# Altium footprint library LQFP.PcbLib: 36 footprints (part 2 of 3)
Each footprint in its own frame and in the unit in brackets; x right, y up, seen from the top. Pads: shape width x height; smd on the part's side, far side on the other; paste and mask are expansions set on the pad; w line width, h text height; cw(c..) or ccw(c..) is an arc to the next point about the centre after c.
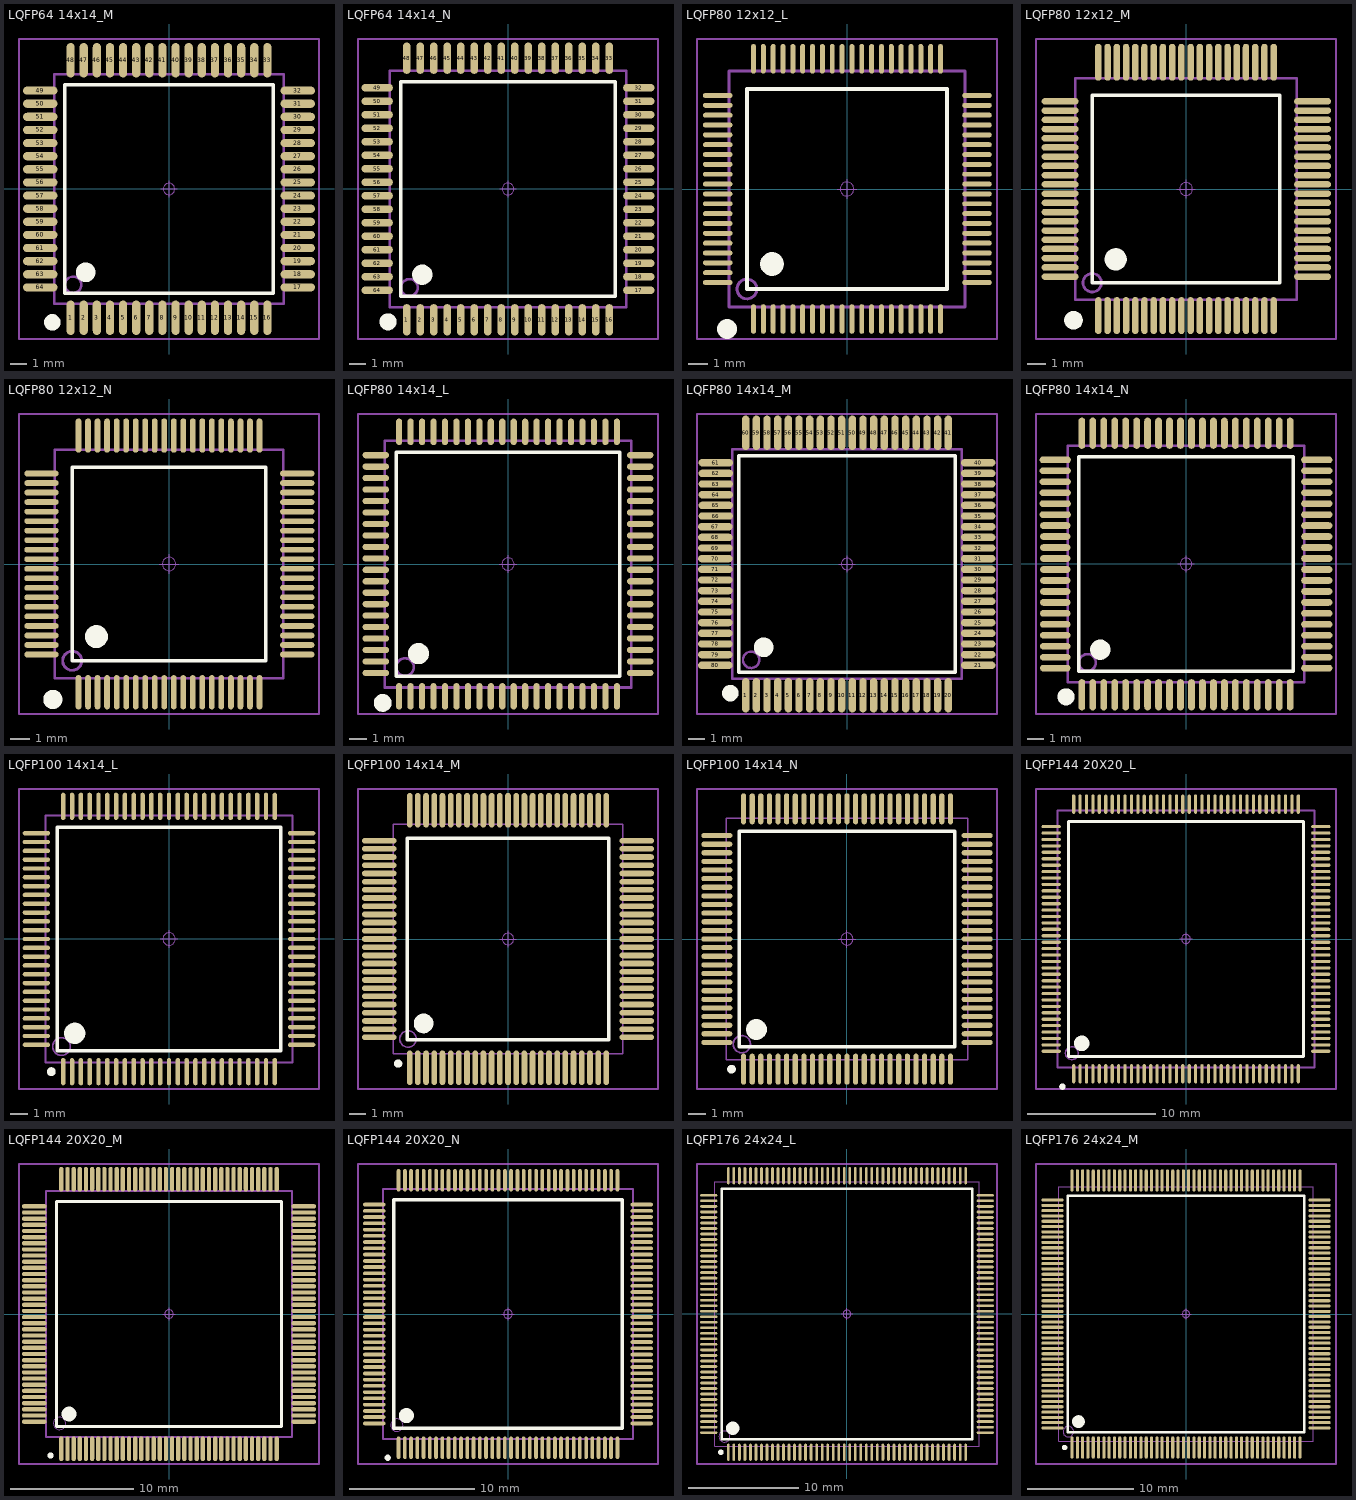
[diagram p1: the footprints below, top view; thin cyan lines are the x and y axes]

## LQFP64 14x14_M [mm] "64脚，体宽14x14mm，脚距0.8mm"
height 1.6
pads (64):
  oval 0.5x2.1 smd: 1(-6,-7.85) 2(-5.2,-7.85) 3(-4.4,-7.85) 4(-3.6,-7.85) 5(-2.8,-7.85) 6(-2,-7.85) 7(-1.2,-7.85) 8(-0.4,-7.85) 9(0.4,-7.85) 10(1.2,-7.85) 11(2,-7.85) 12(2.8,-7.85) 13(3.6,-7.85) 14(4.4,-7.85) 15(5.2,-7.85) 16(6,-7.85) 33(6,7.85) 34(5.2,7.85) 35(4.4,7.85) 36(3.6,7.85) 37(2.8,7.85) 38(2,7.85) 39(1.2,7.85) 40(0.4,7.85) 41(-0.4,7.85) 42(-1.2,7.85) 43(-2,7.85) 44(-2.8,7.85) 45(-3.6,7.85) 46(-4.4,7.85) 47(-5.2,7.85) 48(-6,7.85)
  oval 2.1x0.5 smd: 17(7.85,-6) 18(7.85,-5.2) 19(7.85,-4.4) 20(7.85,-3.6) 21(7.85,-2.8) 22(7.85,-2) 23(7.85,-1.2) 24(7.85,-0.4) 25(7.85,0.4) 26(7.85,1.2) 27(7.85,2) 28(7.85,2.8) 29(7.85,3.6) 30(7.85,4.4) 31(7.85,5.2) 32(7.85,6) 49(-7.85,6) 50(-7.85,5.2) 51(-7.85,4.4) 52(-7.85,3.6) 53(-7.85,2.8) 54(-7.85,2) 55(-7.85,1.2) 56(-7.85,0.4) 57(-7.85,-0.4) 58(-7.85,-1.2) 59(-7.85,-2) 60(-7.85,-2.8) 61(-7.85,-3.6) 62(-7.85,-4.4) 63(-7.85,-5.2) 64(-7.85,-6)
Top Overlay:
  circle w0.6: c-5.08,-5.08 r0.3
  circle w0.508: c-7.112,-8.128 r0.25
  lines w0.2: -6.35,-6.35 -6.35,6.35 6.35,6.35 6.35,-6.35 -6.35,-6.35
Mechanical 13:
  circle w0.15: c-5.842,-5.842 r0.5
  lines w0.15: -7,-7 -7,7 7,7 7,-7 -7,-7
Mechanical 15:
  circle w0.05: c0,0 r0.35
  lines w0.05: -0.5,0 0.5,0 ; 0,-0.5 0,0.5
  lines w0.1: -9.144,-9.144 -9.144,9.144 9.144,9.144 9.144,-9.144 -9.144,-9.144
3D body: height 1.45, standoff 0, extent -8,-8 8,8

## LQFP64 14x14_N [mm] "64脚，体宽14x14mm，脚距0.8mm"
height 1.6
pads (64):
  oval 0.45x1.85 smd: 1(-6,-7.75) 2(-5.2,-7.75) 3(-4.4,-7.75) 4(-3.6,-7.75) 5(-2.8,-7.75) 6(-2,-7.75) 7(-1.2,-7.75) 8(-0.4,-7.75) 9(0.4,-7.75) 10(1.2,-7.75) 11(2,-7.75) 12(2.8,-7.75) 13(3.6,-7.75) 14(4.4,-7.75) 15(5.2,-7.75) 16(6,-7.75) 33(6,7.75) 34(5.2,7.75) 35(4.4,7.75) 36(3.6,7.75) 37(2.8,7.75) 38(2,7.75) 39(1.2,7.75) 40(0.4,7.75) 41(-0.4,7.75) 42(-1.2,7.75) 43(-2,7.75) 44(-2.8,7.75) 45(-3.6,7.75) 46(-4.4,7.75) 47(-5.2,7.75) 48(-6,7.75)
  oval 1.85x0.45 smd: 17(7.75,-6) 18(7.75,-5.2) 19(7.75,-4.4) 20(7.75,-3.6) 21(7.75,-2.8) 22(7.75,-2) 23(7.75,-1.2) 24(7.75,-0.4) 25(7.75,0.4) 26(7.75,1.2) 27(7.75,2) 28(7.75,2.8) 29(7.75,3.6) 30(7.75,4.4) 31(7.75,5.2) 32(7.75,6) 49(-7.75,6) 50(-7.75,5.2) 51(-7.75,4.4) 52(-7.75,3.6) 53(-7.75,2.8) 54(-7.75,2) 55(-7.75,1.2) 56(-7.75,0.4) 57(-7.75,-0.4) 58(-7.75,-1.2) 59(-7.75,-2) 60(-7.75,-2.8) 61(-7.75,-3.6) 62(-7.75,-4.4) 63(-7.75,-5.2) 64(-7.75,-6)
Top Overlay:
  circle w0.6: c-5.08,-5.08 r0.3
  circle w0.508: c-7.112,-7.874 r0.25
  lines w0.2: -6.35,-6.35 -6.35,6.35 6.35,6.35 6.35,-6.35 -6.35,-6.35
Mechanical 13:
  circle w0.15: c-5.842,-5.842 r0.5
  lines w0.15: -7,-7 -7,7 7,7 7,-7 -7,-7
Mechanical 15:
  circle w0.05: c0,0 r0.35
  lines w0.05: -0.5,0 0.5,0 ; 0,-0.5 0,0.5
  lines w0.1: -8.89,-8.89 -8.89,8.89 8.89,8.89 8.89,-8.89 -8.89,-8.89
3D body: height 1.45, standoff 0, extent -8,-8 8,8

## LQFP80 12x12_L [mm] "80脚，体宽12x12mm，脚距0.5mm"
height 1.6
pads (80):
  oval 0.25x1.5 smd: 1(-4.75,-6.604) 2(-4.25,-6.604) 3(-3.75,-6.604) 4(-3.25,-6.604) 5(-2.75,-6.604) 6(-2.25,-6.604) 7(-1.75,-6.604) 8(-1.25,-6.604) 9(-0.75,-6.604) 10(-0.25,-6.604) 11(0.25,-6.604) 12(0.75,-6.604) 13(1.25,-6.604) 14(1.75,-6.604) 15(2.25,-6.604) 16(2.75,-6.604) 17(3.25,-6.604) 18(3.75,-6.604) 19(4.25,-6.604) 20(4.75,-6.604) 41(4.75,6.615) 42(4.25,6.615) 43(3.75,6.615) 44(3.25,6.615) 45(2.75,6.615) 46(2.25,6.615) 47(1.75,6.615) 48(1.25,6.615) 49(0.75,6.615) 50(0.25,6.615) 51(-0.25,6.615) 52(-0.75,6.615) 53(-1.25,6.615) 54(-1.75,6.615) 55(-2.25,6.615) 56(-2.75,6.615) 57(-3.25,6.615) 58(-3.75,6.615) 59(-4.25,6.615) 60(-4.75,6.615)
  oval 1.5x0.25 smd: 21(6.604,-4.75) 22(6.604,-4.25) 23(6.604,-3.75) 24(6.604,-3.25) 25(6.604,-2.75) 26(6.604,-2.25) 27(6.604,-1.75) 28(6.604,-1.25) 29(6.604,-0.75) 30(6.604,-0.25) 31(6.604,0.25) 32(6.604,0.75) 33(6.604,1.25) 34(6.604,1.75) 35(6.604,2.25) 36(6.604,2.75) 37(6.604,3.25) 38(6.604,3.75) 39(6.604,4.25) 40(6.604,4.75) 61(-6.568,4.75) 62(-6.568,4.25) 63(-6.568,3.75) 64(-6.568,3.25) 65(-6.568,2.75) 66(-6.568,2.25) 67(-6.568,1.75) 68(-6.568,1.25) 69(-6.568,0.75) 70(-6.568,0.25) 71(-6.568,-0.25) 72(-6.568,-0.75) 73(-6.568,-1.25) 74(-6.568,-1.75) 75(-6.568,-2.25) 76(-6.568,-2.75) 77(-6.568,-3.25) 78(-6.568,-3.75) 79(-6.568,-4.25) 80(-6.568,-4.75)
Top Overlay:
  circle w0.6: c-3.81,-3.81 r0.3
  circle w0.508: c-6.096,-7.112 r0.25
  lines w0.2: -5.08,-5.08 -5.08,5.08 5.08,5.08 5.08,-5.08 -5.08,-5.08
Mechanical 13:
  circle w0.15: c-5.08,-5.08 r0.5
  lines w0.15: -6,-6 -6,6 6,6 6,-6 -6,-6
Mechanical 15:
  circle w0.05: c0,0 r0.35
  lines w0.05: -0.5,0 0.5,0 ; 0,-0.5 0,0.5
  lines w0.1: -7.62,-7.62 -7.62,7.62 7.62,7.62 7.62,-7.62 -7.62,-7.62
3D body: height 1.45, standoff 0, extent -7,-7 7,7

## LQFP80 12x12_M [mm] "80脚，体宽12x12mm，脚距0.5mm"
height 1.6
pads (80):
  oval 0.35x2 smd: 1(-4.75,-6.858) 2(-4.25,-6.858) 3(-3.75,-6.858) 4(-3.25,-6.858) 5(-2.75,-6.858) 6(-2.25,-6.858) 7(-1.75,-6.858) 8(-1.25,-6.858) 9(-0.75,-6.858) 10(-0.25,-6.858) 11(0.25,-6.858) 12(0.75,-6.858) 13(1.25,-6.858) 14(1.75,-6.858) 15(2.25,-6.858) 16(2.75,-6.858) 17(3.25,-6.858) 18(3.75,-6.858) 19(4.25,-6.858) 20(4.75,-6.858) 41(4.75,6.869) 42(4.25,6.869) 43(3.75,6.869) 44(3.25,6.869) 45(2.75,6.869) 46(2.25,6.869) 47(1.75,6.869) 48(1.25,6.869) 49(0.75,6.869) 50(0.25,6.869) 51(-0.25,6.869) 52(-0.75,6.869) 53(-1.25,6.869) 54(-1.75,6.869) 55(-2.25,6.869) 56(-2.75,6.869) 57(-3.25,6.869) 58(-3.75,6.869) 59(-4.25,6.869) 60(-4.75,6.869)
  oval 2x0.35 smd: 21(6.858,-4.75) 22(6.858,-4.25) 23(6.858,-3.75) 24(6.858,-3.25) 25(6.858,-2.75) 26(6.858,-2.25) 27(6.858,-1.75) 28(6.858,-1.25) 29(6.858,-0.75) 30(6.858,-0.25) 31(6.858,0.25) 32(6.858,0.75) 33(6.858,1.25) 34(6.858,1.75) 35(6.858,2.25) 36(6.858,2.75) 37(6.858,3.25) 38(6.858,3.75) 39(6.858,4.25) 40(6.858,4.75) 61(-6.822,4.75) 62(-6.822,4.25) 63(-6.822,3.75) 64(-6.822,3.25) 65(-6.822,2.75) 66(-6.822,2.25) 67(-6.822,1.75) 68(-6.822,1.25) 69(-6.822,0.75) 70(-6.822,0.25) 71(-6.822,-0.25) 72(-6.822,-0.75) 73(-6.822,-1.25) 74(-6.822,-1.75) 75(-6.822,-2.25) 76(-6.822,-2.75) 77(-6.822,-3.25) 78(-6.822,-3.75) 79(-6.822,-4.25) 80(-6.822,-4.75)
Top Overlay:
  circle w0.508: c-6.096,-7.112 r0.25
  circle w0.6: c-3.81,-3.81 r0.3
  lines w0.2: -5.08,-5.08 5.08,-5.08 5.08,5.08 -5.08,5.08 -5.08,-5.08
Mechanical 13:
  circle w0.15: c-5.08,-5.08 r0.5
  lines w0.15: -6,-6 6,-6 6,6 -6,6 -6,-6
Mechanical 15:
  circle w0.05: c0,0 r0.35
  lines w0.05: -0.5,0 0.5,0 ; 0,-0.5 0,0.5
  lines w0.1: -8.128,-8.128 8.128,-8.128 8.128,8.128 -8.128,8.128 -8.128,-8.128
3D body: height 1.45, standoff 0, extent -7,-7 7,7

## LQFP80 12x12_N [mm] "80脚，体宽12x12mm，脚距0.5mm"
height 1.6
pads (80):
  oval 0.3x1.8 smd: 1(-4.75,-6.731) 2(-4.25,-6.731) 3(-3.75,-6.731) 4(-3.25,-6.731) 5(-2.75,-6.731) 6(-2.25,-6.731) 7(-1.75,-6.731) 8(-1.25,-6.731) 9(-0.75,-6.731) 10(-0.25,-6.731) 11(0.25,-6.731) 12(0.75,-6.731) 13(1.25,-6.731) 14(1.75,-6.731) 15(2.25,-6.731) 16(2.75,-6.731) 17(3.25,-6.731) 18(3.75,-6.731) 19(4.25,-6.731) 20(4.75,-6.731) 41(4.75,6.742) 42(4.25,6.742) 43(3.75,6.742) 44(3.25,6.742) 45(2.75,6.742) 46(2.25,6.742) 47(1.75,6.742) 48(1.25,6.742) 49(0.75,6.742) 50(0.25,6.742) 51(-0.25,6.742) 52(-0.75,6.742) 53(-1.25,6.742) 54(-1.75,6.742) 55(-2.25,6.742) 56(-2.75,6.742) 57(-3.25,6.742) 58(-3.75,6.742) 59(-4.25,6.742) 60(-4.75,6.742)
  oval 1.8x0.3 smd: 21(6.731,-4.75) 22(6.731,-4.25) 23(6.731,-3.75) 24(6.731,-3.25) 25(6.731,-2.75) 26(6.731,-2.25) 27(6.731,-1.75) 28(6.731,-1.25) 29(6.731,-0.75) 30(6.731,-0.25) 31(6.731,0.25) 32(6.731,0.75) 33(6.731,1.25) 34(6.731,1.75) 35(6.731,2.25) 36(6.731,2.75) 37(6.731,3.25) 38(6.731,3.75) 39(6.731,4.25) 40(6.731,4.75) 61(-6.695,4.75) 62(-6.695,4.25) 63(-6.695,3.75) 64(-6.695,3.25) 65(-6.695,2.75) 66(-6.695,2.25) 67(-6.695,1.75) 68(-6.695,1.25) 69(-6.695,0.75) 70(-6.695,0.25) 71(-6.695,-0.25) 72(-6.695,-0.75) 73(-6.695,-1.25) 74(-6.695,-1.75) 75(-6.695,-2.25) 76(-6.695,-2.75) 77(-6.695,-3.25) 78(-6.695,-3.75) 79(-6.695,-4.25) 80(-6.695,-4.75)
Top Overlay:
  circle w0.6: c-3.81,-3.81 r0.3
  circle w0.508: c-6.096,-7.112 r0.25
  lines w0.2: -5.08,-5.08 -5.08,5.08 5.08,5.08 5.08,-5.08 -5.08,-5.08
Mechanical 13:
  circle w0.15: c-5.08,-5.08 r0.5
  lines w0.15: -6,-6 -6,6 6,6 6,-6 -6,-6
Mechanical 15:
  circle w0.05: c0,0 r0.35
  lines w0.05: -0.5,0 0.5,0 ; 0,-0.5 0,0.5
  lines w0.1: -7.874,-7.874 -7.874,7.874 7.874,7.874 7.874,-7.874 -7.874,-7.874
3D body: height 1.45, standoff 0, extent -7,-7 7,7

## LQFP80 14x14_L [mm] "80脚，体宽14x14mm，脚距0.65mm"
height 1.6
pads (80):
  oval 0.35x1.5 smd: 1(-6.175,-7.5) 2(-5.525,-7.5) 3(-4.875,-7.5) 4(-4.225,-7.5) 5(-3.575,-7.5) 6(-2.925,-7.5) 7(-2.275,-7.5) 8(-1.625,-7.5) 9(-0.975,-7.5) 10(-0.325,-7.5) 11(0.325,-7.5) 12(0.975,-7.5) 13(1.625,-7.5) 14(2.275,-7.5) 15(2.925,-7.5) 16(3.575,-7.5) 17(4.225,-7.5) 18(4.875,-7.5) 19(5.525,-7.5) 20(6.175,-7.5) 41(6.175,7.5) 42(5.525,7.5) 43(4.875,7.5) 44(4.225,7.5) 45(3.575,7.5) 46(2.925,7.5) 47(2.275,7.5) 48(1.625,7.5) 49(0.975,7.5) 50(0.325,7.5) 51(-0.325,7.5) 52(-0.975,7.5) 53(-1.625,7.5) 54(-2.275,7.5) 55(-2.925,7.5) 56(-3.575,7.5) 57(-4.225,7.5) 58(-4.875,7.5) 59(-5.525,7.5) 60(-6.175,7.5)
  oval 1.5x0.35 smd: 21(7.5,-6.175) 22(7.5,-5.525) 23(7.5,-4.875) 24(7.5,-4.225) 25(7.5,-3.575) 26(7.5,-2.925) 27(7.5,-2.275) 28(7.5,-1.625) 29(7.5,-0.975) 30(7.5,-0.325) 31(7.5,0.325) 32(7.5,0.975) 33(7.5,1.625) 34(7.5,2.275) 35(7.5,2.925) 36(7.5,3.575) 37(7.5,4.225) 38(7.5,4.875) 39(7.5,5.525) 40(7.5,6.175) 61(-7.5,6.175) 62(-7.5,5.525) 63(-7.5,4.875) 64(-7.5,4.225) 65(-7.5,3.575) 66(-7.5,2.925) 67(-7.5,2.275) 68(-7.5,1.625) 69(-7.5,0.975) 70(-7.5,0.325) 71(-7.5,-0.325) 72(-7.5,-0.975) 73(-7.5,-1.625) 74(-7.5,-2.275) 75(-7.5,-2.925) 76(-7.5,-3.575) 77(-7.5,-4.225) 78(-7.5,-4.875) 79(-7.5,-5.525) 80(-7.5,-6.175)
Top Overlay:
  circle w0.508: c-7.112,-7.874 r0.25
  circle w0.6: c-5.08,-5.08 r0.3
  lines w0.2: -6.35,-6.35 6.35,-6.35 6.35,6.35 -6.35,6.35 -6.35,-6.35
Mechanical 13:
  circle w0.15: c-5.842,-5.842 r0.5
  lines w0.15: -7,-7 7,-7 7,7 -7,7 -7,-7
Mechanical 15:
  circle w0.05: c0,0 r0.35
  lines w0.05: -0.5,0 0.5,0 ; 0,-0.5 0,0.5
  lines w0.1: -8.509,-8.5 8.509,-8.5 8.509,8.509 -8.509,8.509 -8.509,-8.5
3D body: height 1.45, standoff 0, extent -8,-8 8,8

## LQFP80 14x14_M [mm] "80脚，体宽14x14mm，脚距0.65mm"
height 1.6
pads (80):
  oval 0.45x2.1 smd: 1(-6.175,-8) 2(-5.525,-8) 3(-4.875,-8) 4(-4.225,-8) 5(-3.575,-8) 6(-2.925,-8) 7(-2.275,-8) 8(-1.625,-8) 9(-0.975,-8) 10(-0.325,-8) 11(0.325,-8) 12(0.975,-8) 13(1.625,-8) 14(2.275,-8) 15(2.925,-8) 16(3.575,-8) 17(4.225,-8) 18(4.875,-8) 19(5.525,-8) 20(6.175,-8) 41(6.175,8) 42(5.525,8) 43(4.875,8) 44(4.225,8) 45(3.575,8) 46(2.925,8) 47(2.275,8) 48(1.625,8) 49(0.975,8) 50(0.325,8) 51(-0.325,8) 52(-0.975,8) 53(-1.625,8) 54(-2.275,8) 55(-2.925,8) 56(-3.575,8) 57(-4.225,8) 58(-4.875,8) 59(-5.525,8) 60(-6.175,8)
  oval 2.1x0.45 smd: 21(8,-6.175) 22(8,-5.525) 23(8,-4.875) 24(8,-4.225) 25(8,-3.575) 26(8,-2.925) 27(8,-2.275) 28(8,-1.625) 29(8,-0.975) 30(8,-0.325) 31(8,0.325) 32(8,0.975) 33(8,1.625) 34(8,2.275) 35(8,2.925) 36(8,3.575) 37(8,4.225) 38(8,4.875) 39(8,5.525) 40(8,6.175) 61(-8,6.175) 62(-8,5.525) 63(-8,4.875) 64(-8,4.225) 65(-8,3.575) 66(-8,2.925) 67(-8.025,2.275) 68(-8.025,1.625) 69(-8.025,0.975) 70(-8.025,0.325) 71(-8.025,-0.325) 72(-8.025,-0.975) 73(-8.025,-1.625) 74(-8.025,-2.275) 75(-8.025,-2.925) 76(-8.025,-3.575) 77(-8.025,-4.225) 78(-8.025,-4.875) 79(-8.025,-5.525) 80(-8.025,-6.175)
Top Overlay:
  circle w0.508: c-7.112,-7.874 r0.25
  circle w0.6: c-5.08,-5.08 r0.3
  lines w0.2: -6.604,-6.604 6.604,-6.604 6.604,6.604 -6.604,6.604 -6.604,-6.604
Mechanical 13:
  circle w0.15: c-5.842,-5.842 r0.5
  lines w0.15: -7,-7 7,-7 7,7 -7,7 -7,-7
Mechanical 15:
  circle w0.05: c0,0 r0.35
  lines w0.05: -0.5,0 0.5,0 ; 0,-0.5 0,0.5
  lines w0.1: -9.144,-9.144 9.144,-9.144 9.144,9.144 -9.144,9.144 -9.144,-9.144
3D body: height 1.45, standoff 0, extent -8,-8 8,8

## LQFP80 14x14_N [mm] "80脚，体宽14x14mm，脚距0.65mm"
height 1.6
pads (80):
  oval 0.4x1.85 smd: 1(-6.175,-7.75) 2(-5.525,-7.75) 3(-4.875,-7.75) 4(-4.225,-7.75) 5(-3.575,-7.75) 6(-2.925,-7.75) 7(-2.275,-7.75) 8(-1.625,-7.75) 9(-0.975,-7.75) 10(-0.325,-7.75) 11(0.325,-7.75) 12(0.975,-7.75) 13(1.625,-7.75) 14(2.275,-7.75) 15(2.925,-7.75) 16(3.575,-7.75) 17(4.225,-7.75) 18(4.875,-7.75) 19(5.525,-7.75) 20(6.175,-7.75) 41(6.175,7.75) 42(5.525,7.75) 43(4.875,7.75) 44(4.225,7.75) 45(3.575,7.75) 46(2.925,7.75) 47(2.275,7.75) 48(1.625,7.75) 49(0.975,7.75) 50(0.325,7.75) 51(-0.325,7.75) 52(-0.975,7.75) 53(-1.625,7.75) 54(-2.275,7.75) 55(-2.925,7.75) 56(-3.575,7.75) 57(-4.225,7.75) 58(-4.875,7.75) 59(-5.525,7.75) 60(-6.175,7.75)
  oval 1.85x0.4 smd: 21(7.75,-6.175) 22(7.75,-5.525) 23(7.75,-4.875) 24(7.75,-4.225) 25(7.75,-3.575) 26(7.75,-2.925) 27(7.75,-2.275) 28(7.75,-1.625) 29(7.75,-0.975) 30(7.75,-0.325) 31(7.75,0.325) 32(7.75,0.975) 33(7.75,1.625) 34(7.75,2.275) 35(7.75,2.925) 36(7.75,3.575) 37(7.75,4.225) 38(7.75,4.875) 39(7.75,5.525) 40(7.75,6.175) 61(-7.75,6.175) 62(-7.75,5.525) 63(-7.75,4.875) 64(-7.75,4.225) 65(-7.75,3.575) 66(-7.75,2.925)
  oval 1.8x0.4 smd: 67(-7.75,2.275) 68(-7.75,1.625) 69(-7.75,0.975) 70(-7.75,0.325) 71(-7.75,-0.325) 72(-7.75,-0.975) 73(-7.75,-1.625) 74(-7.75,-2.275) 75(-7.75,-2.925) 76(-7.75,-3.575) 77(-7.75,-4.225) 78(-7.75,-4.875) 79(-7.75,-5.525) 80(-7.75,-6.175)
Top Overlay:
  circle w0.508: c-7.112,-7.874 r0.25
  circle w0.6: c-5.08,-5.08 r0.3
  lines w0.2: -6.35,-6.35 6.35,-6.35 6.35,6.35 -6.35,6.35 -6.35,-6.35
Mechanical 13:
  circle w0.15: c-5.842,-5.842 r0.5
  lines w0.15: -7,-7 7,-7 7,7 -7,7 -7,-7
Mechanical 15:
  circle w0.05: c0,0 r0.35
  lines w0.05: -0.5,0 0.5,0 ; 0,-0.5 0,0.5
  lines w0.1: -8.89,-8.89 8.89,-8.89 8.89,8.89 -8.89,8.89 -8.89,-8.89
3D body: height 1.45, standoff 0, extent -8,-8 8,8

## LQFP100 14x14_L [mm] "100脚，体宽14x14mm，脚距0.5mm"
height 1.6
pads (100):
  oval 0.25x1.55 smd: 1(-6,-7.525) 2(-5.5,-7.525) 3(-5,-7.525) 4(-4.5,-7.525) 5(-4,-7.525) 6(-3.5,-7.525) 7(-3,-7.525) 8(-2.5,-7.525) 9(-2,-7.525) 10(-1.5,-7.525) 11(-1,-7.525) 12(-0.5,-7.525) 13(0,-7.525) 14(0.5,-7.525) 15(1,-7.525) 16(1.5,-7.525) 17(2,-7.525) 18(2.5,-7.525) 19(3,-7.525) 20(3.5,-7.525) 21(4,-7.525) 22(4.5,-7.525) 23(5,-7.525) 24(5.5,-7.525) 25(6,-7.525) 51(6,7.525) 52(5.5,7.525) 53(5,7.525) 54(4.5,7.525) 55(4,7.525) 56(3.5,7.525) 57(3,7.525) 58(2.5,7.525) 59(2,7.525) 60(1.5,7.525) 61(1,7.525) 62(0.5,7.525) 63(0,7.525) 64(-0.5,7.525) 65(-1,7.525) 66(-1.5,7.525) 67(-2,7.525) 68(-2.5,7.525) 69(-3,7.525) 70(-3.5,7.525) 71(-4,7.525) 72(-4.5,7.525) 73(-5,7.525) 74(-5.5,7.525) 75(-6,7.525)
  oval 1.55x0.25 smd: 26(7.525,-6) 27(7.525,-5.5) 28(7.525,-5) 29(7.525,-4.5) 30(7.525,-4) 31(7.525,-3.5) 32(7.525,-3) 33(7.525,-2.5) 34(7.525,-2) 35(7.525,-1.5) 36(7.525,-1) 37(7.525,-0.5) 38(7.525,0) 39(7.525,0.5) 40(7.525,1) 41(7.525,1.5) 42(7.525,2) 43(7.525,2.5) 44(7.525,3) 45(7.525,3.5) 46(7.525,4) 47(7.525,4.5) 48(7.525,5) 49(7.525,5.5) 50(7.525,6) 76(-7.525,6) 77(-7.525,5.5) 78(-7.525,5) 79(-7.525,4.5) 80(-7.525,4) 81(-7.525,3.5) 82(-7.525,3) 83(-7.525,2.5) 84(-7.525,2) 85(-7.525,1.5) 86(-7.525,1) 87(-7.525,0.5) 88(-7.525,0) 89(-7.525,-0.5) 90(-7.525,-1) 91(-7.525,-1.5) 92(-7.525,-2) 93(-7.525,-2.5) 94(-7.525,-3) 95(-7.525,-3.5) 96(-7.525,-4) 97(-7.525,-4.5) 98(-7.525,-5) 99(-7.525,-5.5) 100(-7.525,-6)
Top Overlay:
  circle w0.25: c-6.675,-7.525 r0.125
  circle w0.6: c-5.35,-5.35 r0.3
  lines w0.2: -6.35,-6.35 6.35,-6.35 6.35,6.35 -6.35,6.35 -6.35,-6.35
Mechanical 13:
  circle w0.1: c-6.1,-6.1 r0.5
  lines w0.1: -7,-7 7,-7 7,7 -7,7 -7,-7
Mechanical 15:
  circle w0.05: c0,0 r0.35
  lines w0.05: -0.5,0 0.5,0 ; 0,-0.5 0,0.5
  lines w0.1: -8.509,-8.509 8.509,-8.509 8.509,8.509 -8.509,8.509 -8.509,-8.509
3D body: height 1.45, standoff 0, extent -8,-8 8,8

## LQFP100 14x14_M [mm] "100脚，体宽14x14mm，脚距0.5mm"
height 1.6
pads (100):
  oval 0.35x2.1 smd: 1(-6,-7.854) 2(-5.5,-7.854) 3(-5,-7.854) 4(-4.5,-7.854) 5(-4,-7.854) 6(-3.5,-7.854) 7(-3,-7.854) 8(-2.5,-7.854) 9(-2,-7.854) 10(-1.5,-7.854) 11(-1,-7.854) 12(-0.5,-7.854) 13(0,-7.854) 14(0.5,-7.854) 15(1,-7.854) 16(1.5,-7.854) 17(2,-7.854) 18(2.5,-7.854) 19(3,-7.854) 20(3.5,-7.854) 21(4,-7.854) 22(4.5,-7.854) 23(5,-7.854) 24(5.5,-7.854) 25(6,-7.854) 51(6,7.854) 52(5.5,7.854) 53(5,7.854) 54(4.5,7.854) 55(4,7.854) 56(3.5,7.854) 57(3,7.854) 58(2.5,7.854) 59(2,7.854) 60(1.5,7.854) 61(1,7.854) 62(0.5,7.854) 63(0,7.854) 64(-0.5,7.854) 65(-1,7.854) 66(-1.5,7.854) 67(-2,7.854) 68(-2.5,7.854) 69(-3,7.854) 70(-3.5,7.854) 71(-4,7.854) 72(-4.5,7.854) 73(-5,7.854) 74(-5.5,7.854) 75(-6,7.854)
  oval 2.1x0.35 smd: 26(7.854,-6) 27(7.854,-5.5) 28(7.854,-5) 29(7.854,-4.5) 30(7.854,-4) 31(7.854,-3.5) 32(7.854,-3) 33(7.854,-2.5) 34(7.854,-2) 35(7.854,-1.5) 36(7.854,-1) 37(7.854,-0.5) 38(7.854,0) 39(7.854,0.5) 40(7.854,1) 41(7.854,1.5) 42(7.854,2) 43(7.854,2.5) 44(7.854,3) 45(7.854,3.5) 46(7.854,4) 47(7.854,4.5) 48(7.854,5) 49(7.854,5.5) 50(7.854,6) 76(-7.854,6) 77(-7.854,5.5) 78(-7.854,5) 79(-7.854,4.5) 80(-7.854,4) 81(-7.854,3.5) 82(-7.854,3) 83(-7.854,2.5) 84(-7.854,2) 85(-7.854,1.5) 86(-7.854,1) 87(-7.854,0.5) 88(-7.854,0) 89(-7.854,-0.5) 90(-7.854,-1) 91(-7.854,-1.5) 92(-7.854,-2) 93(-7.854,-2.5) 94(-7.854,-3) 95(-7.854,-3.5) 96(-7.854,-4) 97(-7.854,-4.5) 98(-7.854,-5) 99(-7.854,-5.5) 100(-7.854,-6)
Top Overlay:
  circle w0.25: c-6.7,-7.6 r0.125
  circle w0.6: c-5.15,-5.15 r0.3
  lines w0.2: -6.15,-6.15 6.15,-6.15 6.15,6.15 -6.15,6.15 -6.15,-6.15
Mechanical 13:
  circle w0.1: c-6.1,-6.1 r0.5
  lines w0.1: -7,-7 7,-7 7,7 -7,7 -7,-7
Mechanical 15:
  circle w0.05: c0,0 r0.35
  lines w0.05: -0.5,0 0.5,0 ; 0,-0.5 0,0.5
  lines w0.1: -9.15,-9.15 9.15,-9.15 9.15,9.15 -9.15,9.15 -9.15,-9.15
3D body: height 1.45, standoff 0, extent -8,-8 8,8

## LQFP100 14x14_N [mm] "100脚，体宽14x14mm，脚距0.5mm"
height 1.6
pads (100):
  oval 0.3x1.8 smd: 1(-6,-7.55) 2(-5.5,-7.55) 3(-5,-7.55) 4(-4.5,-7.55) 5(-4,-7.55) 6(-3.5,-7.55) 7(-3,-7.55) 8(-2.5,-7.55) 9(-2,-7.55) 10(-1.5,-7.55) 11(-1,-7.55) 12(-0.5,-7.55) 13(0,-7.55) 14(0.5,-7.55) 15(1,-7.55) 16(1.5,-7.55) 17(2,-7.55) 18(2.5,-7.55) 19(3,-7.55) 20(3.5,-7.55) 21(4,-7.55) 22(4.5,-7.55) 23(5,-7.55) 24(5.5,-7.55) 25(6,-7.55) 51(6,7.55) 52(5.5,7.55) 53(5,7.55) 54(4.5,7.55) 55(4,7.55) 56(3.5,7.55) 57(3,7.55) 58(2.5,7.55) 59(2,7.55) 60(1.5,7.55) 61(1,7.55) 62(0.5,7.55) 63(0,7.55) 64(-0.5,7.55) 65(-1,7.55) 66(-1.5,7.55) 67(-2,7.55) 68(-2.5,7.55) 69(-3,7.55) 70(-3.5,7.55) 71(-4,7.55) 72(-4.5,7.55) 73(-5,7.55) 74(-5.5,7.55) 75(-6,7.55)
  oval 1.8x0.3 smd: 26(7.55,-6) 27(7.55,-5.5) 28(7.55,-5) 29(7.55,-4.5) 30(7.55,-4) 31(7.55,-3.5) 32(7.55,-3) 33(7.55,-2.5) 34(7.55,-2) 35(7.55,-1.5) 36(7.55,-1) 37(7.55,-0.5) 38(7.55,0) 39(7.55,0.5) 40(7.55,1) 41(7.55,1.5) 42(7.55,2) 43(7.55,2.5) 44(7.55,3) 45(7.55,3.5) 46(7.55,4) 47(7.55,4.5) 48(7.55,5) 49(7.55,5.5) 50(7.55,6) 76(-7.55,6) 77(-7.55,5.5) 78(-7.55,5) 79(-7.55,4.5) 80(-7.55,4) 81(-7.55,3.5) 82(-7.55,3) 83(-7.55,2.5) 84(-7.55,2) 85(-7.55,1.5) 86(-7.55,1) 87(-7.55,0.5) 88(-7.55,0) 89(-7.55,-0.5) 90(-7.55,-1) 91(-7.55,-1.5) 92(-7.55,-2) 93(-7.55,-2.5) 94(-7.55,-3) 95(-7.55,-3.5) 96(-7.55,-4) 97(-7.55,-4.5) 98(-7.55,-5) 99(-7.55,-5.5) 100(-7.55,-6)
Top Overlay:
  circle w0.25: c-6.7,-7.55 r0.125
  circle w0.6: c-5.25,-5.25 r0.3
  lines w0.2: -6.25,-6.25 6.25,-6.25 6.25,6.25 -6.25,6.25 -6.25,-6.25
Mechanical 13:
  circle w0.1: c-6.1,-6.1 r0.5
  lines w0.1: -7,-7 7,-7 7,7 -7,7 -7,-7
Mechanical 15:
  circle w0.05: c0,0 r0.35
  lines w0.05: -0.5,0 0.5,0 ; 0,-0.5 0,0.5
  lines w0.1: -8.7,-8.7 8.7,-8.7 8.7,8.7 -8.7,8.7 -8.7,-8.7
3D body: height 1.45, standoff 0, extent -8,-8 8,8

## LQFP144 20X20_L [mm] "144脚，体宽20x20mm，脚距0.5mm"
pads (144):
  oval 1.5x0.25 smd: 1(-10.5,8.752) 2(-10.5,8.252) 3(-10.5,7.752) 4(-10.5,7.252) 5(-10.5,6.752) 6(-10.5,6.252) 7(-10.5,5.752) 8(-10.5,5.252) 9(-10.5,4.752) 10(-10.5,4.252) 11(-10.5,3.752) 12(-10.5,3.252) 13(-10.5,2.752) 14(-10.5,2.252) 15(-10.5,1.752) 16(-10.5,1.252) 17(-10.5,0.752) 18(-10.5,0.252) 19(-10.5,-0.248) 20(-10.5,-0.748) 21(-10.5,-1.248) 22(-10.5,-1.748) 23(-10.5,-2.248) 24(-10.5,-2.748) 25(-10.5,-3.248) 26(-10.5,-3.748) 27(-10.5,-4.248) 28(-10.5,-4.748) 29(-10.5,-5.248) 30(-10.5,-5.748) 31(-10.5,-6.248) 32(-10.5,-6.748) 33(-10.5,-7.248) 34(-10.5,-7.748) 35(-10.5,-8.248) 36(-10.5,-8.748) 73(10.5,-8.748) 74(10.5,-8.248) 75(10.5,-7.748) 76(10.5,-7.248) 77(10.5,-6.748) 78(10.5,-6.248) 79(10.5,-5.748) 80(10.5,-5.248) 81(10.5,-4.748) 82(10.5,-4.248) 83(10.5,-3.748) 84(10.5,-3.248) 85(10.5,-2.748) 86(10.5,-2.248) 87(10.5,-1.748) 88(10.5,-1.248) 89(10.5,-0.748) 90(10.5,-0.248) 91(10.5,0.252) 92(10.5,0.752) 93(10.5,1.252) 94(10.5,1.752) 95(10.5,2.252) 96(10.5,2.752) 97(10.5,3.252) 98(10.5,3.752) 99(10.5,4.252) 100(10.5,4.752) 101(10.5,5.252) 102(10.5,5.752) 103(10.5,6.252) 104(10.5,6.752) 105(10.5,7.252) 106(10.5,7.752) 107(10.5,8.252) 108(10.5,8.752)
  oval 0.25x1.5 smd: 37(-8.75,-10.498) 38(-8.25,-10.498) 39(-7.75,-10.498) 40(-7.25,-10.498) 41(-6.75,-10.498) 42(-6.25,-10.498) 43(-5.75,-10.498) 44(-5.25,-10.498) 45(-4.75,-10.498) 46(-4.25,-10.498) 47(-3.75,-10.498) 48(-3.25,-10.498) 49(-2.75,-10.498) 50(-2.25,-10.498) 51(-1.75,-10.498) 52(-1.25,-10.498) 53(-0.75,-10.498) 54(-0.25,-10.498) 55(0.25,-10.498) 56(0.75,-10.498) 57(1.25,-10.498) 58(1.75,-10.498) 59(2.25,-10.498) 60(2.75,-10.498) 61(3.25,-10.498) 62(3.75,-10.498) 63(4.25,-10.498) 64(4.75,-10.498) 65(5.25,-10.498) 66(5.75,-10.498) 67(6.25,-10.498) 68(6.75,-10.498) 69(7.25,-10.498) 70(7.75,-10.498) 71(8.25,-10.498) 72(8.75,-10.498) 109(8.75,10.502) 110(8.25,10.502) 111(7.75,10.502) 112(7.25,10.502) 113(6.75,10.502) 114(6.25,10.502) 115(5.75,10.502) 116(5.25,10.502) 117(4.75,10.502) 118(4.25,10.502) 119(3.75,10.502) 120(3.25,10.502) 121(2.75,10.502) 122(2.25,10.502) 123(1.75,10.502) 124(1.25,10.502) 125(0.75,10.502) 126(0.25,10.502) 127(-0.25,10.502) 128(-0.75,10.502) 129(-1.25,10.502) 130(-1.75,10.502) 131(-2.25,10.502) 132(-2.75,10.502) 133(-3.25,10.502) 134(-3.75,10.502) 135(-4.25,10.502) 136(-4.75,10.502) 137(-5.25,10.502) 138(-5.75,10.502) 139(-6.25,10.502) 140(-6.75,10.502) 141(-7.25,10.502) 142(-7.75,10.502) 143(-8.25,10.502) 144(-8.75,10.502)
Top Overlay:
  circle w0.25: c-9.625,-11.498 r0.125
  circle w0.6: c-8.128,-8.128 r0.3
  lines w0.254: -9.144,-9.144 -9.144,9.144 9.144,9.144 9.144,-9.144 -9.144,-9.144
Mechanical 13:
  circle w0.1: c-8.894,-8.892 r0.5
  lines w0.15: -10,-9.998 10,-9.998 10,10.002 -10,10.002 -10,-9.998
Mechanical 15:
  circle w0.05: c0,0.002 r0.35
  lines w0.05: -0.5,0.002 0.5,0.002 ; 0,-0.498 0,0.502
  lines w0.15: -11.684,-11.684 -11.684,11.684 11.684,11.684 11.684,-11.684 -11.684,-11.684
3D body: height 1.45, standoff 0, extent -11,-10.998 11,11.002

## LQFP144 20X20_M [mm] "144脚，体宽20x20mm，脚距0.5mm"
pads (144):
  oval 2x0.35 smd: 1(-10.95,8.75) 2(-10.95,8.25) 3(-10.95,7.75) 4(-10.95,7.25) 5(-10.95,6.75) 6(-10.95,6.25) 7(-10.95,5.75) 8(-10.95,5.25) 9(-10.95,4.75) 10(-10.95,4.25) 11(-10.95,3.75) 12(-10.95,3.25) 13(-10.95,2.75) 14(-10.95,2.25) 15(-10.95,1.75) 16(-10.95,1.25) 17(-10.95,0.75) 18(-10.95,0.25) 19(-10.95,-0.25) 20(-10.95,-0.75) 21(-10.95,-1.25) 22(-10.95,-1.75) 23(-10.95,-2.25) 24(-10.95,-2.75) 25(-10.95,-3.25) 26(-10.95,-3.75) 27(-10.95,-4.25) 28(-10.95,-4.75) 29(-10.95,-5.25) 30(-10.95,-5.75) 31(-10.95,-6.25) 32(-10.95,-6.75) 33(-10.95,-7.25) 34(-10.95,-7.75) 35(-10.95,-8.25) 36(-10.95,-8.75) 73(10.95,-8.75) 74(10.95,-8.25) 75(10.95,-7.75) 76(10.95,-7.25) 77(10.95,-6.75) 78(10.95,-6.25) 79(10.95,-5.75) 80(10.95,-5.25) 81(10.95,-4.75) 82(10.95,-4.25) 83(10.95,-3.75) 84(10.95,-3.25) 85(10.95,-2.75) 86(10.95,-2.25) 87(10.95,-1.75) 88(10.95,-1.25) 89(10.95,-0.75) 90(10.95,-0.25) 91(10.95,0.25) 92(10.95,0.75) 93(10.95,1.25) 94(10.95,1.75) 95(10.95,2.25) 96(10.95,2.75) 97(10.95,3.25) 98(10.95,3.75) 99(10.95,4.25) 100(10.95,4.75) 101(10.95,5.25) 102(10.95,5.75) 103(10.95,6.25) 104(10.95,6.75) 105(10.95,7.25) 106(10.95,7.75) 107(10.95,8.25) 108(10.95,8.75)
  oval 0.35x2 smd: 37(-8.75,-10.95) 38(-8.25,-10.95) 39(-7.75,-10.95) 40(-7.25,-10.95) 41(-6.75,-10.95) 42(-6.25,-10.95) 43(-5.75,-10.95) 44(-5.25,-10.95) 45(-4.75,-10.95) 46(-4.25,-10.95) 47(-3.75,-10.95) 48(-3.25,-10.95) 49(-2.75,-10.95) 50(-2.25,-10.95) 51(-1.75,-10.95) 52(-1.25,-10.95) 53(-0.75,-10.95) 54(-0.25,-10.95) 55(0.25,-10.95) 56(0.75,-10.95) 57(1.25,-10.95) 58(1.75,-10.95) 59(2.25,-10.95) 60(2.75,-10.95) 61(3.25,-10.95) 62(3.75,-10.95) 63(4.25,-10.95) 64(4.75,-10.95) 65(5.25,-10.95) 66(5.75,-10.95) 67(6.25,-10.95) 68(6.75,-10.95) 69(7.25,-10.95) 70(7.75,-10.95) 71(8.25,-10.95) 72(8.75,-10.95) 109(8.75,10.95) 110(8.25,10.95) 111(7.75,10.95) 112(7.25,10.95) 113(6.75,10.95) 114(6.25,10.95) 115(5.75,10.95) 116(5.25,10.95) 117(4.75,10.95) 118(4.25,10.95) 119(3.75,10.95) 120(3.25,10.95) 121(2.75,10.95) 122(2.25,10.95) 123(1.75,10.95) 124(1.25,10.95) 125(0.75,10.95) 126(0.25,10.95) 127(-0.25,10.95) 128(-0.75,10.95) 129(-1.25,10.95) 130(-1.75,10.95) 131(-2.25,10.95) 132(-2.75,10.95) 133(-3.25,10.95) 134(-3.75,10.95) 135(-4.25,10.95) 136(-4.75,10.95) 137(-5.25,10.95) 138(-5.75,10.95) 139(-6.25,10.95) 140(-6.75,10.95) 141(-7.25,10.95) 142(-7.75,10.95) 143(-8.25,10.95) 144(-8.75,10.95)
Top Overlay:
  circle w0.25: c-9.625,-11.5 r0.125
  circle w0.6: c-8.128,-8.13 r0.3
  lines w0.254: -9.144,-9.146 -9.144,9.142 9.144,9.142 9.144,-9.146 -9.144,-9.146
Mechanical 13:
  circle w0.1: c-8.894,-8.894 r0.5
  lines w0.15: -10,-10 10,-10 10,10 -10,10 -10,-10
Mechanical 15:
  circle w0.05: c0,0 r0.35
  lines w0.05: -0.5,0 0.5,0 ; 0,-0.5 0,0.5
  lines w0.15: -12.192,-12.192 -12.192,12.192 12.192,12.192 12.192,-12.192 -12.192,-12.192
3D body: height 1.45, standoff 0, extent -11,-11 11,11

## LQFP144 20X20_N [mm] "144脚，体宽20x20mm，脚距0.5mm"
pads (144):
  oval 1.8x0.3 smd: 1(-10.7,8.75) 2(-10.7,8.25) 3(-10.7,7.75) 4(-10.7,7.25) 5(-10.7,6.75) 6(-10.7,6.25) 7(-10.7,5.75) 8(-10.7,5.25) 9(-10.7,4.75) 10(-10.7,4.25) 11(-10.7,3.75) 12(-10.7,3.25) 13(-10.7,2.75) 14(-10.7,2.25) 15(-10.7,1.75) 16(-10.7,1.25) 17(-10.7,0.75) 18(-10.7,0.25) 19(-10.7,-0.25) 20(-10.7,-0.75) 21(-10.7,-1.25) 22(-10.7,-1.75) 23(-10.7,-2.25) 24(-10.7,-2.75) 25(-10.7,-3.25) 26(-10.7,-3.75) 27(-10.7,-4.25) 28(-10.7,-4.75) 29(-10.7,-5.25) 30(-10.7,-5.75) 31(-10.7,-6.25) 32(-10.7,-6.75) 33(-10.7,-7.25) 34(-10.7,-7.75) 35(-10.7,-8.25) 36(-10.7,-8.75) 73(10.7,-8.75) 74(10.7,-8.25) 75(10.7,-7.75) 76(10.7,-7.25) 77(10.7,-6.75) 78(10.7,-6.25) 79(10.7,-5.75) 80(10.7,-5.25) 81(10.7,-4.75) 82(10.7,-4.25) 83(10.7,-3.75) 84(10.7,-3.25) 85(10.7,-2.75) 86(10.7,-2.25) 87(10.7,-1.75) 88(10.7,-1.25) 89(10.7,-0.75) 90(10.7,-0.25) 91(10.7,0.25) 92(10.7,0.75) 93(10.7,1.25) 94(10.7,1.75) 95(10.7,2.25) 96(10.7,2.75) 97(10.7,3.25) 98(10.7,3.75) 99(10.7,4.25) 100(10.7,4.75) 101(10.7,5.25) 102(10.7,5.75) 103(10.7,6.25) 104(10.7,6.75) 105(10.7,7.25) 106(10.7,7.75) 107(10.7,8.25) 108(10.7,8.75)
  oval 0.3x1.8 smd: 37(-8.75,-10.7) 38(-8.25,-10.7) 39(-7.75,-10.7) 40(-7.25,-10.7) 41(-6.75,-10.7) 42(-6.25,-10.7) 43(-5.75,-10.7) 44(-5.25,-10.7) 45(-4.75,-10.7) 46(-4.25,-10.7) 47(-3.75,-10.7) 48(-3.25,-10.7) 49(-2.75,-10.7) 50(-2.25,-10.7) 51(-1.75,-10.7) 52(-1.25,-10.7) 53(-0.75,-10.7) 54(-0.25,-10.7) 55(0.25,-10.7) 56(0.75,-10.7) 57(1.25,-10.7) 58(1.75,-10.7) 59(2.25,-10.7) 60(2.75,-10.7) 61(3.25,-10.7) 62(3.75,-10.7) 63(4.25,-10.7) 64(4.75,-10.7) 65(5.25,-10.7) 66(5.75,-10.7) 67(6.25,-10.7) 68(6.75,-10.7) 69(7.25,-10.7) 70(7.75,-10.7) 71(8.25,-10.7) 72(8.75,-10.7) 109(8.75,10.7) 110(8.25,10.7) 111(7.75,10.7) 112(7.25,10.7) 113(6.75,10.7) 114(6.25,10.7) 115(5.75,10.7) 116(5.25,10.7) 117(4.75,10.7) 118(4.25,10.7) 119(3.75,10.7) 120(3.25,10.7) 121(2.75,10.7) 122(2.25,10.7) 123(1.75,10.7) 124(1.25,10.7) 125(0.75,10.7) 126(0.25,10.7) 127(-0.25,10.7) 128(-0.75,10.7) 129(-1.25,10.7) 130(-1.75,10.7) 131(-2.25,10.7) 132(-2.75,10.7) 133(-3.25,10.7) 134(-3.75,10.7) 135(-4.25,10.7) 136(-4.75,10.7) 137(-5.25,10.7) 138(-5.75,10.7) 139(-6.25,10.7) 140(-6.75,10.7) 141(-7.25,10.7) 142(-7.75,10.7) 143(-8.25,10.7) 144(-8.75,10.7)
Top Overlay:
  circle w0.25: c-9.625,-11.5 r0.125
  circle w0.6: c-8.128,-8.13 r0.3
  lines w0.254: -9.144,-9.146 -9.144,9.142 9.144,9.142 9.144,-9.146 -9.144,-9.146
Mechanical 13:
  circle w0.1: c-8.894,-8.894 r0.5
  lines w0.15: -10,-10 10,-10 10,10 -10,10 -10,-10
Mechanical 15:
  circle w0.05: c0,0 r0.35
  lines w0.05: -0.5,0 0.5,0 ; 0,-0.5 0,0.5
  lines w0.15: -12,-12 -12,12 12,12 12,-12 -12,-12
3D body: height 1.45, standoff 0, extent -11,-11 11,11

## LQFP176 24x24_L [mm] "176脚，体宽24x24mm，脚距0.5mm"
height 1.6
pads (176):
  oval 0.25x1.55 smd: 1(-10.75,-12.525) 2(-10.25,-12.525) 3(-9.75,-12.525) 4(-9.25,-12.525) 5(-8.75,-12.525) 6(-8.25,-12.525) 7(-7.75,-12.525) 8(-7.25,-12.525) 9(-6.75,-12.525) 10(-6.25,-12.525) 11(-5.75,-12.525) 12(-5.25,-12.525) 13(-4.75,-12.525) 14(-4.25,-12.525) 15(-3.75,-12.525) 16(-3.25,-12.525) 17(-2.75,-12.525) 18(-2.25,-12.525) 19(-1.75,-12.525) 20(-1.25,-12.525) 21(-0.75,-12.525) 22(-0.25,-12.525) 23(0.25,-12.525) 24(0.75,-12.525) 25(1.25,-12.525) 26(1.75,-12.525) 27(2.25,-12.525) 28(2.75,-12.525) 29(3.25,-12.525) 30(3.75,-12.525) 31(4.25,-12.525) 32(4.75,-12.525) 33(5.25,-12.525) 34(5.75,-12.525) 35(6.25,-12.525) 36(6.75,-12.525) 37(7.25,-12.525) 38(7.75,-12.525) 39(8.25,-12.525) 40(8.75,-12.525) 41(9.25,-12.525) 42(9.75,-12.525) 43(10.25,-12.525) 44(10.75,-12.525) 89(10.75,12.525) 90(10.25,12.525) 91(9.75,12.525) 92(9.25,12.525) 93(8.75,12.525) 94(8.25,12.525) 95(7.75,12.525) 96(7.25,12.525) 97(6.75,12.525) 98(6.25,12.525) 99(5.75,12.525) 100(5.25,12.525) 101(4.75,12.525) 102(4.25,12.525) 103(3.75,12.525) 104(3.25,12.525) 105(2.75,12.525) 106(2.25,12.525) 107(1.75,12.525) 108(1.25,12.525) 109(0.75,12.525) 110(0.25,12.525) 111(-0.25,12.525) 112(-0.75,12.525) 113(-1.25,12.525) 114(-1.75,12.525) 115(-2.25,12.525) 116(-2.75,12.525) 117(-3.25,12.525) 118(-3.75,12.525) 119(-4.25,12.525) 120(-4.75,12.525) 121(-5.25,12.525) 122(-5.75,12.525) 123(-6.25,12.525) 124(-6.75,12.525) 125(-7.25,12.525) 126(-7.75,12.525) 127(-8.25,12.525) 128(-8.75,12.525) 129(-9.25,12.525) 130(-9.75,12.525) 131(-10.25,12.525) 132(-10.75,12.525)
  oval 1.55x0.25 smd: 45(12.525,-10.75) 46(12.525,-10.25) 47(12.525,-9.75) 48(12.525,-9.25) 49(12.525,-8.75) 50(12.525,-8.25) 51(12.525,-7.75) 52(12.525,-7.25) 53(12.525,-6.75) 54(12.525,-6.25) 55(12.525,-5.75) 56(12.525,-5.25) 57(12.525,-4.75) 58(12.525,-4.25) 59(12.525,-3.75) 60(12.525,-3.25) 61(12.525,-2.75) 62(12.525,-2.25) 63(12.525,-1.75) 64(12.525,-1.25) 65(12.525,-0.75) 66(12.525,-0.25) 67(12.525,0.25) 68(12.525,0.75) 69(12.525,1.25) 70(12.525,1.75) 71(12.525,2.25) 72(12.525,2.75) 73(12.525,3.25) 74(12.525,3.75) 75(12.525,4.25) 76(12.525,4.75) 77(12.525,5.25) 78(12.525,5.75) 79(12.525,6.25) 80(12.525,6.75) 81(12.525,7.25) 82(12.525,7.75) 83(12.525,8.25) 84(12.525,8.75) 85(12.525,9.25) 86(12.525,9.75) 87(12.525,10.25) 88(12.525,10.75) 133(-12.525,10.75) 134(-12.525,10.25) 135(-12.525,9.75) 136(-12.525,9.25) 137(-12.525,8.75) 138(-12.525,8.25) 139(-12.525,7.75) 140(-12.525,7.25) 141(-12.525,6.75) 142(-12.525,6.25) 143(-12.525,5.75) 144(-12.525,5.25) 145(-12.525,4.75) 146(-12.525,4.25) 147(-12.525,3.75) 148(-12.525,3.25) 149(-12.525,2.75) 150(-12.525,2.25) 151(-12.525,1.75) 152(-12.525,1.25) 153(-12.525,0.75) 154(-12.525,0.25) 155(-12.525,-0.25) 156(-12.525,-0.75) 157(-12.525,-1.25) 158(-12.525,-1.75) 159(-12.525,-2.25) 160(-12.525,-2.75) 161(-12.525,-3.25) 162(-12.525,-3.75) 163(-12.525,-4.25) 164(-12.525,-4.75) 165(-12.525,-5.25) 166(-12.525,-5.75) 167(-12.525,-6.25) 168(-12.525,-6.75) 169(-12.525,-7.25) 170(-12.525,-7.75) 171(-12.525,-8.25) 172(-12.525,-8.75) 173(-12.525,-9.25) 174(-12.525,-9.75) 175(-12.525,-10.25) 176(-12.525,-10.75)
Top Overlay:
  circle w0.6: c-10.35,-10.35 r0.3
  circle w0.25: c-11.425,-12.525 r0.125
  lines w0.2: -11.35,-11.35 -11.35,11.35 11.35,11.35 11.35,-11.35 -11.35,-11.35
Mechanical 13:
  circle w0.1: c-11.1,-11.1 r0.5
  lines w0.1: -12,-12 -12,12 12,12 12,-12 -12,-12
Mechanical 15:
  circle w0.05: c0,0 r0.35
  lines w0.05: -0.5,0 0.5,0 ; 0,-0.5 0,0.5
  lines w0.15: -13.589,-13.589 -13.589,13.589 13.589,13.589 13.589,-13.589 -13.589,-13.589
3D body: height 1.45, standoff 0, extent -13,-13 13,13

## LQFP176 24x24_M [mm] "176脚，体宽24x24mm，脚距0.5mm"
height 1.6
pads (176):
  oval 0.3x2.1 smd: 1(-10.75,-12.6) 2(-10.25,-12.6) 3(-9.75,-12.6) 4(-9.25,-12.6) 5(-8.75,-12.6) 6(-8.25,-12.6) 7(-7.75,-12.6) 8(-7.25,-12.6) 9(-6.75,-12.6) 10(-6.25,-12.6) 11(-5.75,-12.6) 12(-5.25,-12.6) 13(-4.75,-12.6) 14(-4.25,-12.6) 15(-3.75,-12.6) 16(-3.25,-12.6) 17(-2.75,-12.6) 18(-2.25,-12.6) 19(-1.75,-12.6) 20(-1.25,-12.6) 21(-0.75,-12.6) 22(-0.25,-12.6) 23(0.25,-12.6) 24(0.75,-12.6) 25(1.25,-12.6) 26(1.75,-12.6) 27(2.25,-12.6) 28(2.75,-12.6) 29(3.25,-12.6) 30(3.75,-12.6) 31(4.25,-12.6) 32(4.75,-12.6) 33(5.25,-12.6) 34(5.75,-12.6) 35(6.25,-12.6) 36(6.75,-12.6) 37(7.25,-12.6) 38(7.75,-12.6) 39(8.25,-12.6) 40(8.75,-12.6) 41(9.25,-12.6) 42(9.75,-12.6) 43(10.25,-12.6) 44(10.75,-12.6) 89(10.75,12.6) 90(10.25,12.6) 91(9.75,12.6) 92(9.25,12.6) 93(8.75,12.6) 94(8.25,12.6) 95(7.75,12.6) 96(7.25,12.6) 97(6.75,12.6) 98(6.25,12.6) 99(5.75,12.6) 100(5.25,12.6) 101(4.75,12.6) 102(4.25,12.6) 103(3.75,12.6) 104(3.25,12.6) 105(2.75,12.6) 106(2.25,12.6) 107(1.75,12.6) 108(1.25,12.6) 109(0.75,12.6) 110(0.25,12.6) 111(-0.25,12.6) 112(-0.75,12.6) 113(-1.25,12.6) 114(-1.75,12.6) 115(-2.25,12.6) 116(-2.75,12.6) 117(-3.25,12.6) 118(-3.75,12.6) 119(-4.25,12.6) 120(-4.75,12.6) 121(-5.25,12.6) 122(-5.75,12.6) 123(-6.25,12.6) 124(-6.75,12.6) 125(-7.25,12.6) 126(-7.75,12.6) 127(-8.25,12.6) 128(-8.75,12.6) 129(-9.25,12.6) 130(-9.75,12.6) 131(-10.25,12.6) 132(-10.75,12.6)
  oval 2.1x0.3 smd: 45(12.6,-10.75) 46(12.6,-10.25) 47(12.6,-9.75) 48(12.6,-9.25) 49(12.6,-8.75) 50(12.6,-8.25) 51(12.6,-7.75) 52(12.6,-7.25) 53(12.6,-6.75) 54(12.6,-6.25) 55(12.6,-5.75) 56(12.6,-5.25) 57(12.6,-4.75) 58(12.6,-4.25) 59(12.6,-3.75) 60(12.6,-3.25) 61(12.6,-2.75) 62(12.6,-2.25) 63(12.6,-1.75) 64(12.6,-1.25) 65(12.6,-0.75) 66(12.6,-0.25) 67(12.6,0.25) 68(12.6,0.75) 69(12.6,1.25) 70(12.6,1.75) 71(12.6,2.25) 72(12.6,2.75) 73(12.6,3.25) 74(12.6,3.75) 75(12.6,4.25) 76(12.6,4.75) 77(12.6,5.25) 78(12.6,5.75) 79(12.6,6.25) 80(12.6,6.75) 81(12.6,7.25) 82(12.6,7.75) 83(12.6,8.25) 84(12.6,8.75) 85(12.6,9.25) 86(12.6,9.75) 87(12.6,10.25) 88(12.6,10.75) 133(-12.6,10.75) 134(-12.6,10.25) 135(-12.6,9.75) 136(-12.6,9.25) 137(-12.6,8.75) 138(-12.6,8.25) 139(-12.6,7.75) 140(-12.6,7.25) 141(-12.6,6.75) 142(-12.6,6.25) 143(-12.6,5.75) 144(-12.6,5.25) 145(-12.6,4.75) 146(-12.6,4.25) 147(-12.6,3.75) 148(-12.6,3.25) 149(-12.6,2.75) 150(-12.6,2.25) 151(-12.6,1.75) 152(-12.6,1.25) 153(-12.6,0.75) 154(-12.6,0.25) 155(-12.6,-0.25) 156(-12.6,-0.75) 157(-12.6,-1.25) 158(-12.6,-1.75) 159(-12.6,-2.25) 160(-12.6,-2.75) 161(-12.6,-3.25) 162(-12.6,-3.75) 163(-12.6,-4.25) 164(-12.6,-4.75) 165(-12.6,-5.25) 166(-12.6,-5.75) 167(-12.6,-6.25) 168(-12.6,-6.75) 169(-12.6,-7.25) 170(-12.6,-7.75) 171(-12.6,-8.25) 172(-12.6,-8.75) 173(-12.6,-9.25) 174(-12.6,-9.75) 175(-12.6,-10.25) 176(-12.6,-10.75)
Top Overlay:
  circle w0.25: c-11.45,-12.6 r0.125
  circle w0.6: c-10.15,-10.15 r0.3
  lines w0.2: -11.15,-11.15 11.15,-11.15 11.15,11.15 -11.15,11.15 -11.15,-11.15
Mechanical 13:
  circle w0.1: c-11.1,-11.1 r0.5
  lines w0.1: -12,-12 12,-12 12,12 -12,12 -12,-12
Mechanical 15:
  circle w0.05: c0,0 r0.35
  lines w0.05: -0.5,0 0.5,0 ; 0,-0.5 0,0.5
  lines w0.15: -14.15,-14.15 14.15,-14.15 14.15,14.15 -14.15,14.15 -14.15,-14.15
3D body: height 1.45, standoff 0, extent -13,-13 13,13